# Altium footprint library Conectores.PcbLib: 122 footprints (part 1 of 8)
Each footprint in its own frame and in the unit in brackets; x right, y up, seen from the top. Pads: shape width x height; smd on the part's side, far side on the other; paste and mask are expansions set on the pad; w line width, h text height; cw(c..) or ccw(c..) is an arc to the next point about the centre after c.
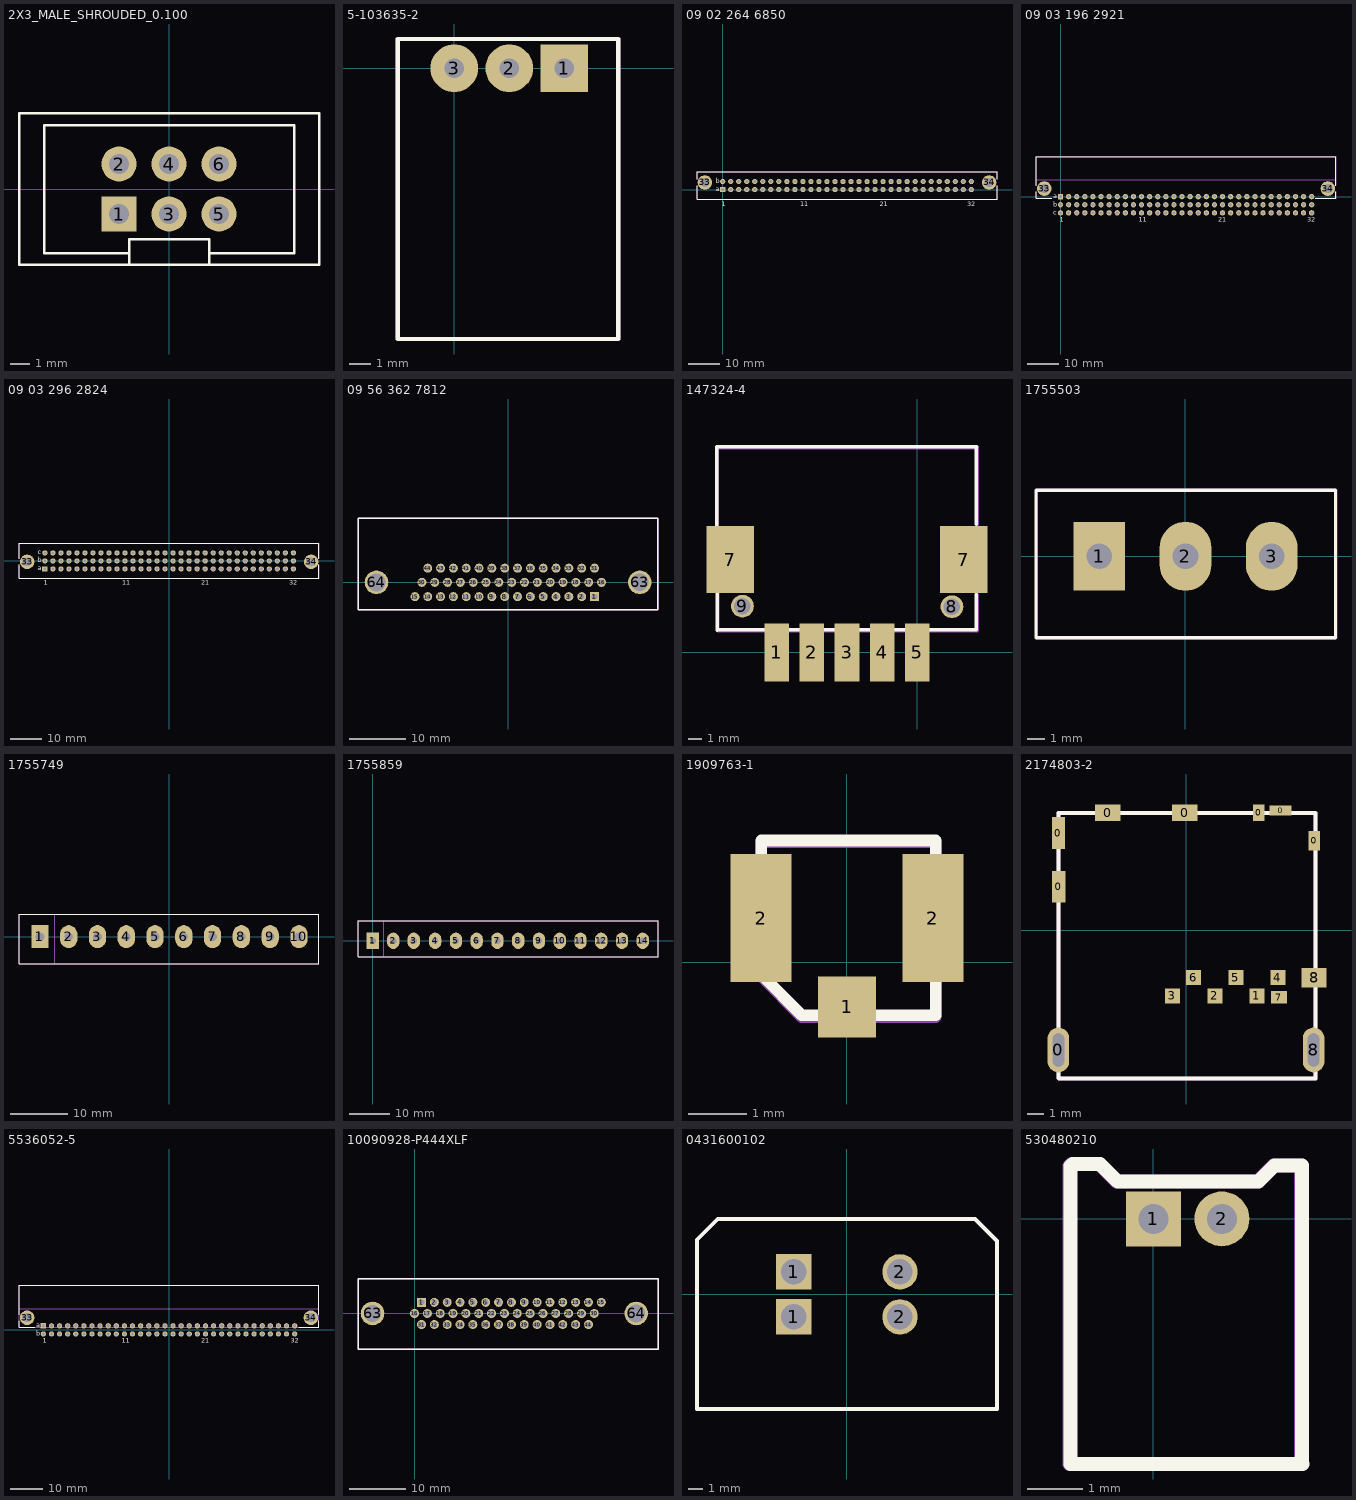
[diagram p0: the footprints below, top view; thin cyan lines are the x and y axes]

## 2X3_MALE_SHROUDED_0.100 [mil]
pads (6):
  rect 70x70 hole 40: 1(-100,-50)
  round 70 hole 40: 2(-100,50) 3(0,-50) 4(0,50) 5(100,-50) 6(100,50)
Top Overlay:
  lines w5: -80,-150 -80,-128 ; 80,-150 80,-128 ; -80,-128 -250,-128 -250,128 250,128 250,-128 80,-128 ; -80,-128 -80,-100 80,-100 80,-128 ; -300,-151.5 -300,151.5 300,151.5 300,-151.5 -300,-151.5
3D body "Header2x3-shrouded-vertical.step": height 362.03, standoff -124.71, extent -300.39,-184.57 299.61,195.8

## 5-103635-2 [mm] "CONN HEADER RT/A .100 3POS 15AU"
pads (3):
  rect 2.2x2.2 hole 0.9: 1(5.08,0)
  round 2.2 hole 0.9: 2(2.54,0) 3(0,0)
Top Overlay:
  lines w0.2: -2.6,-12.49 7.56,-12.49 7.56,1.35 -2.6,1.35 -2.6,-12.49
Mechanical 29:
  lines w0.2: -2.6,-12.49 -2.6,1.35 7.56,1.35 7.56,-12.49 -2.6,-12.49
  text "'.Designator'" at -0.42,-11.64 h0.5
  text "1" at 4.99,-2.19 h0.5
3D body "c-5-103635-2-s-3d.stp": height 6.6, standoff -3.68, extent -2.6,-12.524 7.56,1.064

## 09 02 264 6850 [mm]
pads (66):
  round 4.6 hole 2.8: 33(-5.63,2.24) 34(84.37,2.24)
  rect 1.65x1.65 hole 1: A1(0,0)
  round 1.65 hole 1: A2(2.54,0) A3(5.08,0) A4(7.62,0) A5(10.16,0) A6(12.7,0) A7(15.24,0) A8(17.78,0) A9(20.32,0) A10(22.86,0) A11(25.4,0) A12(27.94,0) A13(30.48,0) A14(33.02,0) A15(35.56,0) A16(38.1,0) A17(40.64,0) A18(43.18,0) A19(45.72,0) A20(48.26,0) A21(50.8,0) A22(53.34,0) A23(55.88,0) A24(58.42,0) A25(60.96,0) A26(63.5,0) A27(66.04,0) A28(68.58,0) A29(71.12,0) A30(73.66,0) A31(76.2,0) A32(78.74,0) B1(0,2.54) B2(2.54,2.54) B3(5.08,2.54) B4(7.62,2.54) B5(10.16,2.54) B6(12.7,2.54) B7(15.24,2.54) B8(17.78,2.54) B9(20.32,2.54) B10(22.86,2.54) B11(25.4,2.54) B12(27.94,2.54) B13(30.48,2.54) B14(33.02,2.54) B15(35.56,2.54) B16(38.1,2.54) B17(40.64,2.54) B18(43.18,2.54) B19(45.72,2.54) B20(48.26,2.54) B21(50.8,2.54) B22(53.34,2.54) B23(55.88,2.54) B24(58.42,2.54) B25(60.96,2.54) B26(63.5,2.54) B27(66.04,2.54) B28(68.58,2.54) B29(71.12,2.54) B30(73.66,2.54) B31(76.2,2.54) B32(78.74,2.54)
Top Overlay:
  lines w0.2: -8.13,1.14 -8.13,-3.03 86.87,-3.03 86.87,1.14 ; -8.13,3.34 -8.13,5.57 86.87,5.57 86.87,3.34
  text "21" at 49.8,-5.21 h1.5
  text "11" at 24.55,-5.21 h1.5
  text "32" at 77.49,-5.21 h1.5
  text "b" at -2.21,2.04 h1.5
  text "a" at -2.21,-0.5 h1.5
  text "1" at -0.25,-5.21 h1.5
Mechanical 29:
  lines w0.2: -8.13,1.14 -8.13,-3.03 86.87,-3.03 86.87,1.14 ; -8.13,3.34 -8.13,5.57 86.87,5.57 86.87,3.34
  text "1" at -0.25,-5.21 h1.5
  text "a" at -2.21,-0.5 h1.5
  text "b" at -2.21,2.04 h1.5
  text "32" at 77.49,-5.21 h1.5
  text "11" at 24.55,-5.21 h1.5
  text "21" at 49.8,-5.21 h1.5
  text "'.Designator'" at -7.228,-2.432 h0.5
3D body "DIN41612 0 PCB Hembra 64 pines.stp": height 11.6, standoff -4.5, extent -8.112,-2.709 86.788,5.291

## 09 03 196 2921 [mm] "DIN41612 96 pines recto macho para PCB"
pads (98):
  round 4.6 hole 2.8: 33(-5.08,2.54) 34(83.82,2.54)
  rect 1.65x1.65 hole 1: A1(0,0)
  round 1.65 hole 1: A2(2.54,0) A3(5.08,0) A4(7.62,0) A5(10.16,0) A6(12.7,0) A7(15.24,0) A8(17.78,0) A9(20.32,0) A10(22.86,0) A11(25.4,0) A12(27.94,0) A13(30.48,0) A14(33.02,0) A15(35.56,0) A16(38.1,0) A17(40.64,0) A18(43.18,0) A19(45.72,0) A20(48.26,0) A21(50.8,0) A22(53.34,0) A23(55.88,0) A24(58.42,0) A25(60.96,0) A26(63.5,0) A27(66.04,0) A28(68.58,0) A29(71.12,0) A30(73.66,0) A31(76.2,0) A32(78.74,0) B1(0,-2.54) B2(2.54,-2.54) B3(5.08,-2.54) B4(7.62,-2.54) B5(10.16,-2.54) B6(12.7,-2.54) B7(15.24,-2.54) B8(17.78,-2.54) B9(20.32,-2.54) B10(22.86,-2.54) B11(25.4,-2.54) B12(27.94,-2.54) B13(30.48,-2.54) B14(33.02,-2.54) B15(35.56,-2.54) B16(38.1,-2.54) B17(40.64,-2.54) B18(43.18,-2.54) B19(45.72,-2.54) B20(48.26,-2.54) B21(50.8,-2.54) B22(53.34,-2.54) B23(55.88,-2.54) B24(58.42,-2.54) B25(60.96,-2.54) B26(63.5,-2.54) B27(66.04,-2.54) B28(68.58,-2.54) B29(71.12,-2.54) B30(73.66,-2.54) B31(76.2,-2.54) B32(78.74,-2.54) C1(0,-5.08) C2(2.54,-5.08) C3(5.08,-5.08) C4(7.62,-5.08) C5(10.16,-5.08) C6(12.7,-5.08) C7(15.24,-5.08) C8(17.78,-5.08) C9(20.32,-5.08) C10(22.86,-5.08) C11(25.4,-5.08) C12(27.94,-5.08) C13(30.48,-5.08) C14(33.02,-5.08) C15(35.56,-5.08) C16(38.1,-5.08) C17(40.64,-5.08) C18(43.18,-5.08) C19(45.72,-5.08) C20(48.26,-5.08) C21(50.8,-5.08) C22(53.34,-5.08) C23(55.88,-5.08) C24(58.42,-5.08) C25(60.96,-5.08) C26(63.5,-5.08) C27(66.04,-5.08) C28(68.58,-5.08) C29(71.12,-5.08) C30(73.66,-5.08) C31(76.2,-5.08) C32(78.74,-5.08)
Top Overlay:
  lines w0.2: -7.69,1.48 -7.69,-0.56 -2.76,-0.56 ; -7.69,3.48 -7.69,12.58 86.31,12.58 86.31,3.48 ; 79.905,-0.56 86.31,-0.56 86.31,1.48
  text "1" at -0.31,-7.84 h1.5
  text "a" at -2.27,-0.56 h1.5
  text "b" at -2.27,-3.1 h1.5
  text "c" at -2.27,-5.64 h1.5
  text "32" at 77.43,-7.84 h1.5
  text "11" at 24.465,-7.84 h1.5
  text "21" at 49.49,-7.84 h1.5
Mechanical 1:
  lines w0.1: -7.63,5.3 86.37,5.3
  text "PCB Edge" at -7.1,5.8 h0.6
Mechanical 29:
  lines w0.2: -7.63,1.54 -7.63,-0.5 -2.7,-0.5 ; -7.63,3.54 -7.63,12.64 86.37,12.64 86.37,3.54 ; 79.965,-0.5 86.37,-0.5 86.37,1.54
  text "21" at 49.55,-7.78 h1.5
  text "11" at 24.525,-7.78 h1.5
  text "32" at 77.49,-7.78 h1.5
  text "c" at -2.21,-5.58 h1.5
  text "b" at -2.21,-3.04 h1.5
  text "a" at -2.21,-0.5 h1.5
  text "1" at -0.25,-7.78 h1.5
  text "'.Designator'" at -6.908,11.248 h0.5
3D body "09 03 196 2921.step": height 9.4, standoff -2.68, extent -7.62,-5.328 86.38,12.694

## 09 03 296 2824 [mm] "DIN41612 96 pines Hembra"
pads (98):
  round 4.6 hole 2.8: 33(-45,-0.3) 34(45,-0.3)
  rect 1.65x1.65 hole 1: A1(-39.37,-2.54)
  round 1.65 hole 1: A2(-36.83,-2.54) A3(-34.29,-2.54) A4(-31.75,-2.54) A5(-29.21,-2.54) A6(-26.67,-2.54) A7(-24.13,-2.54) A8(-21.59,-2.54) A9(-19.05,-2.54) A10(-16.51,-2.54) A11(-13.97,-2.54) A12(-11.43,-2.54) A13(-8.89,-2.54) A14(-6.35,-2.54) A15(-3.81,-2.54) A16(-1.27,-2.54) A17(1.27,-2.54) A18(3.81,-2.54) A19(6.35,-2.54) A20(8.89,-2.54) A21(11.43,-2.54) A22(13.97,-2.54) A23(16.51,-2.54) A24(19.05,-2.54) A25(21.59,-2.54) A26(24.13,-2.54) A27(26.67,-2.54) A28(29.21,-2.54) A29(31.75,-2.54) A30(34.29,-2.54) A31(36.83,-2.54) A32(39.37,-2.54) B1(-39.37,0) B2(-36.83,0) B3(-34.29,0) B4(-31.75,0) B5(-29.21,0) B6(-26.67,0) B7(-24.13,0) B8(-21.59,0) B9(-19.05,0) B10(-16.51,0) B11(-13.97,0) B12(-11.43,0) B13(-8.89,0) B14(-6.35,0) B15(-3.81,0) B16(-1.27,0) B17(1.27,0) B18(3.81,0) B19(6.35,0) B20(8.89,0) B21(11.43,0) B22(13.97,0) B23(16.51,0) B24(19.05,0) B25(21.59,0) B26(24.13,0) B27(26.67,0) B28(29.21,0) B29(31.75,0) B30(34.29,0) B31(36.83,0) B32(39.37,0) C1(-39.37,2.54) C2(-36.83,2.54) C3(-34.29,2.54) C4(-31.75,2.54) C5(-29.21,2.54) C6(-26.67,2.54) C7(-24.13,2.54) C8(-21.59,2.54) C9(-19.05,2.54) C10(-16.51,2.54) C11(-13.97,2.54) C12(-11.43,2.54) C13(-8.89,2.54) C14(-6.35,2.54) C15(-3.81,2.54) C16(-1.27,2.54) C17(1.27,2.54) C18(3.81,2.54) C19(6.35,2.54) C20(8.89,2.54) C21(11.43,2.54) C22(13.97,2.54) C23(16.51,2.54) C24(19.05,2.54) C25(21.59,2.54) C26(24.13,2.54) C27(26.67,2.54) C28(29.21,2.54) C29(31.75,2.54) C30(34.29,2.54) C31(36.83,2.54) C32(39.37,2.54)
Top Overlay:
  lines w0.2: -47.56,-1.3 -47.56,-5.55 47.44,-5.55 47.44,-1.3 ; -47.56,0.7 -47.56,5.55 47.44,5.55 47.44,0.7
  text "1" at -39.68,-7.525 h1.5
  text "a" at -41.64,-3.04 h1.5
  text "b" at -41.64,-0.5 h1.5
  text "c" at -41.64,2.04 h1.5
  text "32" at 38.06,-7.525 h1.5
  text "11" at -14.88,-7.525 h1.5
  text "21" at 10.12,-7.525 h1.5
Mechanical 29:
  lines w0.2: -47.5,-1.3 -47.5,-5.55 47.5,-5.55 47.5,-1.3 ; -47.5,0.7 -47.5,5.55 47.5,5.55 47.5,0.7
  text "'.Designator'" at -46.678,4.328 h0.5
  text "21" at 10.18,-7.525 h1.5
  text "11" at -14.82,-7.525 h1.5
  text "32" at 38.12,-7.525 h1.5
  text "c" at -41.58,2.04 h1.5
  text "b" at -41.58,-0.5 h1.5
  text "a" at -41.58,-3.04 h1.5
  text "1" at -39.62,-7.525 h1.5
3D body "DIN41612-C-96-F.step": height 11.6, standoff -2.96, extent -47.422,-5.325 47.478,5.275

## 09 56 362 7812 [mm] "High Density D Sub, 44 pos, male, pcb"
pads (46):
  rect 1.6x1.6 hole 1: 1(15.42,-2.54)
  round 1.6 hole 1: 2(13.13,-2.54) 3(10.84,-2.54) 4(8.55,-2.54) 5(6.26,-2.54) 6(3.97,-2.54) 7(1.68,-2.54) 8(-0.61,-2.54) 9(-2.9,-2.54) 10(-5.19,-2.54) 11(-7.48,-2.54) 12(-9.77,-2.54) 13(-12.06,-2.54) 14(-14.35,-2.54) 15(-16.64,-2.54) 16(16.67,0) 17(14.38,0) 18(12.09,0) 19(9.8,0) 20(7.51,0) 21(5.22,0) 22(2.93,0) 23(0.64,0) 24(-1.65,0) 25(-3.94,0) 26(-6.23,0) 27(-8.52,0) 28(-10.81,0) 29(-13.1,0) 30(-15.39,0) 31(15.42,2.54) 32(13.13,2.54) 33(10.84,2.54) 34(8.55,2.54) 35(6.26,2.54) 36(3.97,2.54) 37(1.68,2.54) 38(-0.61,2.54) 39(-2.9,2.54) 40(-5.19,2.54) 41(-7.48,2.54) 42(-9.77,2.54) 43(-12.06,2.54) 44(-14.35,2.54)
  round 4.2 hole 3.1: 63(23.5,0)
  round 4.2 hole 3.2: 64(-23.5,0)
Top Overlay:
  lines w0.254: -26.8,-4.87 26.7,-4.87 26.7,11.43 -26.8,11.43 -26.8,-4.87
Mechanical 29:
  lines w0.254: -26.75,-4.87 -26.75,11.43 26.75,11.43 26.75,-4.87 -26.75,-4.87
  text "'.Designator'" at -25.868,10.058 h0.5
  text "1" at 16.99,-2.86 h0.8
3D body "44P-MALE-ASM0001_ASM.STEP": height 12.55, standoff -4, extent -26.91,-4.62 26.75,17.08

## 147324-4 [mm] "CONN HEADER 5POS R/A TIN SMD"
pads (9):
  rect 1.78x4.19 smd: 1(-10.16,0) 2(-7.62,0) 3(-5.08,0) 4(-2.54,0) 5(0,0)
  rect 3.45x4.83 smd: 7(-13.54,6.73) 7(3.38,6.73)
  round 1.65 hole 1.2: 8(2.53,3.31) 9(-12.66,3.35)
Top Overlay:
  lines w0.254: -14.53,9.23 -14.53,14.91 -14.52,14.9 4.31,14.9 4.3,14.89 4.3,9.3 ; -14.5,4.29 -14.5,1.62 -14.49,1.63 4.3,1.63 4.3,4.22
Mechanical 29:
  lines w0.254: -14.48,9.18 -14.48,14.86 -14.47,14.85 4.36,14.85 4.35,14.84 4.35,9.25 ; -14.45,4.24 -14.45,1.57 -14.44,1.58 4.35,1.58 4.35,4.17
  text "1" at -0.06,2.81 h0.5
  text "'.Designator'" at -8.14,11.58 h0.5
3D body "c-0147324-04-j-3d.stp": height 7.11, standoff -1.29, extent -14.459,-1.72 4.39,14.92

## 1755503 [mm] "10 Position Terminal Block Header, Male Pins"
pads (3):
  rect 3x4 hole 1.5: 1(-5,0)
  oval 3x4 hole 1.5: 2(0,0) 3(5,0)
Top Overlay:
  lines w0.2: -8.67,-4.73 -8.67,3.83 8.7,3.83 8.7,-4.73 -8.67,-4.73
Mechanical 29:
  lines w0.2: -8.64,-4.73 8.73,-4.73 8.73,3.83 -8.64,3.83 -8.64,-4.73
  text "1" at -5.13,2.6 h0.5
  text "'.Designator'" at -2.738,-3.962 h0.5
3D body "1755749.STEP": height 12, standoff -3.9, extent -8.54,-4.85 8.7,3.75

## 1755749 [mm] "10 Position Terminal Block Header"
pads (10):
  rect 3x4 hole 1.5: 1(-22.5,0)
  oval 3x4 hole 1.5: 2(-17.5,0) 3(-12.5,0) 4(-7.5,0) 5(-2.5,0) 6(2.5,0) 7(7.5,0) 8(12.5,0) 9(17.5,0) 10(22.5,0)
Top Overlay:
  lines w0.2: -26.14,-4.73 25.99,-4.73 25.99,3.92 -26.14,3.92 -26.14,-4.73
Mechanical 29:
  lines w0.2: -19.96,-4.69 -19.96,3.92 ; -26.14,-4.73 -26.14,3.92 25.99,3.92 25.99,-4.73 -26.14,-4.73
  text "'.Designator'" at -23.598,-3.712 h0.5
3D body "1755503.STEP": height 12.05, standoff -3.85, extent -26.06,-4.68 25.94,3.92

## 1755859 [mm] "14 Position Terminal Block Header"
pads (14):
  rect 3x4 hole 1.5: 1(0,0)
  oval 3x4 hole 1.5: 2(5,0) 3(10,0) 4(15.24,0) 5(20.32,0) 6(25.4,0) 7(30.48,0) 8(35.56,0) 9(40.64,0) 10(45.72,0) 11(50.8,0) 12(55.88,0) 13(60.96,0) 14(66.04,0)
Top Overlay:
  lines w0.2: -3.64,-3.95 69.78,-3.95 69.78,4.865 -3.64,4.865 -3.64,-3.95
Mechanical 29:
  lines w0.2: 2.68,-3.99 2.68,4.825 ; -3.64,-3.95 -3.64,4.865 69.78,4.865 69.78,-3.95 -3.64,-3.95
  text "'.Designator'" at -1.058,2.888 h0.5
3D body "1755859_03.stp": height 12, standoff -3.9, extent -3.49,-3.78 69.63,4.82

## 1909763-1 [mm] "Ultra Miniature Coaxial Connector Jack, Male Pin 50 Ohm Surface Mount Solder"
pads (3):
  rect 1x1.05 smd: 1(0,-0.763)
  rect 1.05x2.2 smd: 2(-1.475,0.763) 2(1.475,0.763)
Top Overlay:
  lines w0.2: -1.475,-0.208 -1.475,2.093 1.525,2.093 1.525,-0.907 -0.775,-0.907 -1.475,-0.208
Mechanical 29:
  lines w0.2: -1.475,-0.238 -0.775,-0.937 1.525,-0.937 1.525,2.063 -1.475,2.063 -1.475,-0.238
  text "'.Designator'" at -0.333,0.471 h0.5
3D body "c-1909763-1-b-3d.stp": height 1.2, standoff -0.03, extent -1.475,-0.888 1.525,2.212

## 2174803-2 [mm] "Conn Micro SIM Card 6 POS 2.54mm Solder RA SMD Embossed T/R"
pads (17):
  oval 1.3x2.7 hole 0.7 slot 2 at 90 deg: 0(-7.69,-7.203) 8(7.66,-7.203)
  rect 0.8x1.9 smd: 0(-7.69,5.847) 0(-7.664,2.617)
  rect 1.53x1 smd: 0(-4.725,7.057) 0(-0.09,7.057)
  rect 0.7x1 smd: 0(4.36,7.057)
  rect 1.33x0.6 smd: 0(5.675,7.203)
  rect 0.7x1.17 smd: 0(7.71,5.382)
  rect 0.9x0.9 smd: 1(4.25,-3.945) 2(1.72,-3.945) 3(-0.83,-3.945) 4(5.52,-2.853) 5(2.98,-2.853) 6(0.44,-2.853)
  rect 0.97x0.75 smd: 7(5.58,-4.03)
  rect 1.5x1.17 smd: 8(7.69,-2.853)
Top Overlay:
  lines w0.254: -7.69,-7.203 -7.69,7.051 -7.688,7.053 7.756,7.053 7.781,7.028 7.781,-8.923 -7.662,-8.923 -7.688,-8.898 -7.688,-5.824
Mechanical 29:
  lines w0.254: -7.69,-7.203 -7.69,7.051 -7.688,7.053 7.756,7.053 7.781,7.028 7.781,-8.923 -7.662,-8.923 -7.688,-8.898 -7.688,-5.824
  text "'.Designator'" at -0.358,-0.072 h0.5
3D body "2174803-2.stp": height 1.28, standoff -0.61, extent -7.709,-8.973 7.781,7.027

## 5536052-5 [mm] "CON 41612 64 pin PLUG Right"
pads (66):
  round 4.6 hole 2.8: 33(-44.559,3.702) 34(44.341,3.702)
  rect 1.65x1.65 hole 1: A1(-39.479,1.162)
  round 1.65 hole 1: A2(-36.939,1.162) A3(-34.399,1.162) A4(-31.859,1.162) A5(-29.319,1.162) A6(-26.779,1.162) A7(-24.239,1.162) A8(-21.699,1.162) A9(-19.159,1.162) A10(-16.619,1.162) A11(-14.079,1.162) A12(-11.539,1.162) A13(-8.999,1.162) A14(-6.459,1.162) A15(-3.919,1.162) A16(-1.379,1.162) A17(1.161,1.162) A18(3.701,1.162) A19(6.241,1.162) A20(8.781,1.162) A21(11.321,1.162) A22(13.861,1.162) A23(16.401,1.162) A24(18.941,1.162) A25(21.481,1.162) A26(24.021,1.162) A27(26.561,1.162) A28(29.101,1.162) A29(31.641,1.162) A30(34.181,1.162) A31(36.721,1.162) A32(39.261,1.162) B1(-39.479,-1.378) B2(-36.939,-1.378) B3(-34.399,-1.378) B4(-31.859,-1.378) B5(-29.319,-1.378) B6(-26.779,-1.378) B7(-24.239,-1.378) B8(-21.699,-1.378) B9(-19.159,-1.378) B10(-16.619,-1.378) B11(-14.079,-1.378) B12(-11.539,-1.378) B13(-8.999,-1.378) B14(-6.459,-1.378) B15(-3.919,-1.378) B16(-1.379,-1.378) B17(1.161,-1.378) B18(3.701,-1.378) B19(6.241,-1.378) B20(8.781,-1.378) B21(11.321,-1.378) B22(13.861,-1.378) B23(16.401,-1.378) B24(18.941,-1.378) B25(21.481,-1.378) B26(24.021,-1.378) B27(26.561,-1.378) B28(29.101,-1.378) B29(31.641,-1.378) B30(34.181,-1.378) B31(36.721,-1.378) B32(39.261,-1.378)
Top Overlay:
  lines w0.2: -47.109,2.702 -47.109,0.662 -42.179,0.662 ; -47.109,4.702 -47.109,13.802 46.891,13.802 46.891,4.702 ; 40.486,0.662 46.891,0.662 46.891,2.702
  text "21" at 10.071,-4.078 h1.5
  text "11" at -14.954,-4.078 h1.5
  text "32" at 38.011,-4.078 h1.5
  text "b" at -41.689,-1.878 h1.5
  text "a" at -41.689,0.662 h1.5
  text "1" at -39.729,-4.078 h1.5
Mechanical 1:
  lines w0.1: -47.109,6.462 46.891,6.462
  text "PCB Edge" at -46.579,6.962 h0.6
Mechanical 13:
  lines w0.1: -47.109,0.662 -47.109,13.802 46.891,13.802 46.891,0.662 -47.109,0.662
Mechanical 29:
  lines w0.2: -47.109,2.702 -47.109,0.662 -42.179,0.662 ; -47.109,4.702 -47.109,13.802 46.891,13.802 46.891,4.702 ; 40.486,0.662 46.891,0.662 46.891,2.702
  text "'.Designator'" at -44.56,9.01 h0.5
  text "1" at -39.729,-4.078 h1.5
  text "a" at -41.689,0.662 h1.5
  text "b" at -41.689,-1.878 h1.5
  text "32" at 38.011,-4.078 h1.5
  text "11" at -14.954,-4.078 h1.5
  text "21" at 10.071,-4.078 h1.5
3D body "DIN41612 90 PCB Macho 64 pines.stp": height 6.85, standoff -2.98, extent -47.105,-1.693 46.895,13.787

## 10090928-P444XLF [mm] "D-Sub 44 pines"
pads (46):
  rect 1.6x1.6 hole 1: 1(1.25,1.98)
  round 1.6 hole 1: 2(3.54,1.98) 3(5.83,1.98) 4(8.12,1.98) 5(10.41,1.98) 6(12.7,1.98) 7(14.99,1.98) 8(17.28,1.98) 9(19.57,1.98) 10(21.86,1.98) 11(24.15,1.98) 12(26.44,1.98) 13(28.73,1.98) 14(31.02,1.98) 15(33.31,1.98) 16(0,0) 17(2.29,0) 18(4.58,0) 19(6.87,0) 20(9.16,0) 21(11.45,0) 22(13.74,0) 23(16.03,0) 24(18.32,0) 25(20.61,0) 26(22.9,0) 27(25.19,0) 28(27.48,0) 29(29.77,0) 30(32.06,0) 31(1.25,-1.98) 32(3.54,-1.98) 33(5.83,-1.98) 34(8.12,-1.98) 35(10.41,-1.98) 36(12.7,-1.98) 37(14.99,-1.98) 38(17.28,-1.98) 39(19.57,-1.98) 40(21.86,-1.98) 41(24.15,-1.98) 42(26.44,-1.98) 43(28.73,-1.98) 44(31.02,-1.98)
  round 4.2 hole 3.1: 63(-7.486,0)
  round 4.2 hole 3.2: 64(39.529,0)
Top Overlay:
  lines w0.254: -10.08,-6.378 43.42,-6.378 43.42,6.191 -10.08,6.191 -10.08,-6.378
Mechanical 29:
  lines w0.254: -10.08,-6.378 -10.08,6.191 43.42,6.191 43.42,-6.378 -10.08,-6.378
  text "'.Designator'" at -9.248,-5.612 h0.5
3D body "10090928-P44.stp": height 11.95, standoff -3.15, extent -10.464,-6.287 42.536,6.263

## 0431600102 [mm] "CONN HDR 2POS 7.50MM PCB SLDR"
pads (4):
  rect 2.5x2.5 hole 1.8: 1(-3.75,-1.59) 1(-3.75,1.59)
  round 2.5 hole 1.8: 2(3.75,-1.59) 2(3.75,1.59)
Top Overlay:
  lines w0.254: -10.583,-8.092 -10.583,3.846 -9.109,5.319 9.052,5.319 10.601,3.769 10.601,-8.092 -10.583,-8.092
Mechanical 29:
  lines w0.254: -10.583,-8.092 10.601,-8.092 10.601,3.769 9.052,5.319 -9.109,5.319 -10.583,3.846 -10.583,-8.092
  text "1" at -3.87,3.62 h0.8
  text "'.Designator'" at -9.668,-7.452 h0.5
3D body "431600102.stp": height 14.78, standoff -3.79, extent -10.557,-8.054 10.525,5.331

## 530480210 [mm] "CONN HEADER 2POS 1.25MM R/A TIN"
pads (2):
  rect 1x1 hole 0.55: 1(0,0)
  round 1 hole 0.55: 2(1.25,0)
Top Overlay:
  lines w0.254: -1.51,-4.47 2.72,-4.47 2.71,-4.46 2.71,0.97 2.21,0.97 1.92,0.68 -0.65,0.68 -0.97,1 -1.47,1 -1.51,0.96 -1.51,-4.47
Mechanical 29:
  lines w0.254: -1.53,-4.47 -1.53,0.96 -1.49,1 -0.99,1 -0.67,0.68 1.9,0.68 2.19,0.97 2.69,0.97 2.69,-4.46 2.7,-4.47 -1.53,-4.47
  text "1" at -0.11,-1.71 h0.8
  text "'.Designator'" at 0.26,-3.29 h0.5
3D body "530480210.stp": height 3.52, standoff -2.28, extent -1.53,-4.48 2.72,1.02